# Altium schematic symbol library Analog Devices Data Converters Analog-to-Digital Converters.SchLib: 2404 symbols (part 15 of 213) (continued)
## AD7147WPACPZ-1500R (continued)

## AD7147WPACPZ-RL
designator U?
13 Channel CapTouch Programmable Controller for Single-Electrode Capacitance Sensors, 111SPS, -40 to +85 degC, CP-24-3, Pb-Free, Reel; Generic Part Number: AD7147; Manufacturer: Analog Devices; PartNumber: AD7147WPACPZ-RL; Resolution (Bits): 16; Channels: 13; Throughput Rate (SPS): 111; Interface: I2C/Ser 2-Wire, Ser, SPI; Automotive Qualified: Yes; DatasheetVersion: Rev.D; PackageVersion: Jan-2005; PackageReference: CP-24-3; PackageDescription: 24-Lead Lead Frame Chip Scale Package [LFCSP_VQ] 4 x 4 mm Body, Very Thin Quad; Supplier 1: Digi-Key; Supplier Part Number 1: AD7147WPACPZ-RL-ND; Supplier 2: Mouser; Supplier Part Number 2: 584-AD7147WPACPZ-R; RoHS: Y; Packing: Reel; Mounting Technology: Surface Mount; Code_JEDEC: MO-220-VGGD-8; ComponentLink1Description: Manufacturer URL; ComponentLink1URL: http://www.analog.com/en/index.html; ComponentLink2Description: Datasheet; ComponentLink2URL: http://www.analog.com/static/imported-files/data_sheets/AD7147.pdf; ComponentLink3Description: Package Specification; ComponentLink3URL: http://www.analog.com/static/imported-files/packages/56702234806764CP_24_3.pdf; ComponentLink4Description: Product URL; ComponentLink4URL: http://www.analog.com/en/analog-to-digital-converters/ad-converters/ad7147/products/product.html
footprint CP-24-3_N (QFN, 24-Leads, Body 4x4mm, Pitch 0.5mm, Thermal Pad 2.5x2.5mm, IPC Medium Density)
footprint CP-24-3_L (QFN, 24-Leads, Body 4x4mm, Pitch 0.5mm, Thermal Pad 2.5x2.5mm, IPC High Density)
footprint CP-24-3_M (QFN, 24-Leads, Body 4x4mm, Pitch 0.5mm, Thermal Pad 2.5x2.5mm, IPC Low Density)
pins: 1 CIN6 (in) "Capacitance Sensor Input.", 2 CIN7 (in) "Capacitance Sensor Input.", 3 CIN8 (in) "Capacitance Sensor Input.", 4 CIN9 (in) "Capacitance Sensor Input.", 5 CIN10 (in) "Capacitance Sensor Input.", 6 CIN11 (in) "Capacitance Sensor Input.", 7 CIN12 (in) "Capacitance Sensor Input.", 8 ACSHIELD (out) "CDC Active Shield Output. Connect to external shield or plane.", 9 BIAS "Bias Node for Internal Circuitry. Requires 100 nF capacitor to ground.", 10 GND (power) "Ground Reference Point for All Circuitry.", 11 VCC (power) "Supply Voltage.", 12 VDRIVE (power) "Serial Interface Operating Voltage Supply.", 13 SDO (hiz) "SPI Serial Data Output.", 14 SDI (in) "SPI Serial Data Input.", 15 SCLK (in) "Clock Input for Serial Interface.", 16 ~{CS} (in) "SPI Chip Select Signal.", 17 ~{INT} (oc) "General-Purpose Open-Drain Interrupt Output. Programmable polarity; requires pull-up resistor.", 18 GPIO (io) "Programmable GPIO.", 19 CIN0 (in) "Capacitance Sensor Input.", 20 CIN1 (in) "Capacitance Sensor Input.", 21 CIN2 (in) "Capacitance Sensor Input.", 22 CIN3 (in) "Capacitance Sensor Input.", 23 CIN4 (in) "Capacitance Sensor Input.", 24 CIN5 (in) "Capacitance Sensor Input.", 25 EP (power) "Capacitance Sensor Input."

## AD7148ACPZ-1REEL
designator U?
Octal 16-Bit Analog-to-Digital Converter with I2C/Ser 2-Wire, Serial Interface, 250kSPS, -40 to +85 degC, CP-16-13, Pb-Free, Reel; Generic Part Number: AD7148; Manufacturer: Analog Devices; PartNumber: AD7148ACPZ-1REEL; Resolution (Bits): 16; Channels: 8; Throughput Rate (SPS): 4; DatasheetVersion: Rev.A; PackageVersion: 031006-A; PackageReference: CP-16-13; PackageDescription: 16-Lead Lead Frame Chip Scale Package [LFCSP_VQ] 4 x 4 mm Body, Very Thin Quad; Supplier 1: Digi-Key; Supplier Part Number 1: AD7148ACPZ-1REEL-ND; Supplier 2: Mouser; Supplier Part Number 2: 584-AD7148ACPZ-1R; Interface: I2C/Ser 2-Wire, Ser; RoHS: Y; Packing: Reel; Mounting Technology: Surface Mount; Code_JEDEC: MO-220-VGGC; ComponentLink1Description: Manufacturer URL; ComponentLink1URL: http://www.analog.com/en/index.html; ComponentLink2Description: Datasheet; ComponentLink2URL: http://www.analog.com/static/imported-files/data_sheets/AD7148.pdf; ComponentLink3Description: Package Specification; ComponentLink3URL: http://www.analog.com/static/imported-files/packages/PKG_PDF/LFCSP(CP)/CP-16/CP_16_13.pdf; ComponentLink4Description: Product URL; ComponentLink4URL: http://www.analog.com/en/analog-to-digital-converters/ad-converters/ad7148/products/product.html
footprint CP-16-13_N (QFN, 16-Leads, Body 4x4mm, Pitch 0.65mm, Thermal Pad 2.5x2.5mm, IPC Medium Density)
footprint CP-16-13_L (QFN, 16-Leads, Body 4x4mm, Pitch 0.65mm, Thermal Pad 2.5x2.5mm, IPC High Density)
footprint CP-16-13_M (QFN, 16-Leads, Body 4x4mm, Pitch 0.65mm, Thermal Pad 2.5x2.5mm, IPC Low Density)
pins: 1 CIN4 (in) "Capacitance Sensor Input.", 2 CIN5 (in) "Capacitance Sensor Input.", 3 CIN6 (in) "Capacitance Sensor Input.", 4 CIN7 (in) "Capacitance Sensor Input.", 5 ACSHIELD (out) "CDC Active Shield Output. Connect to external shield.", 6 BIAS "Bias Node for Internal Circuitry. Requires 100 nF capacitor to ground.", 7 GND (power) "Ground Reference Point for All Circuitry.", 8 VCC (power) "Supply Voltage.", 9 VDRIVE (power) "Serial Interface Operating Voltage Supply.", 10 SDA (io) "I2C Serial Data Input/Output. SDA requires pull-up resistor.", 11 SCLK (in) "Clock Input for Serial Interface.", 12 ~{INT} (oc) "General-Purpose Open-Drain Interrupt Output. Programmable polarity; requires pull-up resistor.", 13 CIN0 (in) "Capacitance Sensor Input.", 14 CIN1 (in) "Capacitance Sensor Input.", 15 CIN2 (in) "Capacitance Sensor Input.", 16 CIN3 (in) "Capacitance Sensor Input.", 17 EP (power) "The exposed pad is not connected internally. For increased reliability of the solder joint and maximum thermal capability, it is recommended that the pad be soldered to the ground plane."

## AD7148ACPZ-1500RL7
designator U?
Octal 16-Bit Analog-to-Digital Converter with I2C/Ser 2-Wire, Serial Interface, 250kSPS, -40 to +85 degC, CP-16-13, Pb-Free, Reel; Generic Part Number: AD7148; Manufacturer: Analog Devices; PartNumber: AD7148ACPZ-1500RL7; Resolution (Bits): 16; Channels: 8; Throughput Rate (SPS): 4; DatasheetVersion: Rev.A; PackageVersion: 031006-A; PackageReference: CP-16-13; PackageDescription: 16-Lead Lead Frame Chip Scale Package [LFCSP_VQ] 4 x 4 mm Body, Very Thin Quad; Supplier 1: Digi-Key; Supplier Part Number 1: AD7148ACPZ-1500RL7TR-ND; Supplier 2: Digi-Key; Supplier Part Number 2: AD7148ACPZ-1500RL7CT-ND; Supplier 3: Digi-Key; Supplier Part Number 3: AD7148ACPZ-1500RL7DKR-ND; Supplier 4: Newark; Supplier Part Number 4: 84M7803; Supplier 5: Mouser; Supplier Part Number 5: 584-AD7148ACPZ1500R7; Interface: I2C/Ser 2-Wire, Ser; RoHS: Y; Packing: Reel; Mounting Technology: Surface Mount; Code_JEDEC: MO-220-VGGC; ComponentLink1Description: Manufacturer URL; ComponentLink1URL: http://www.analog.com/en/index.html; ComponentLink2Description: Datasheet; ComponentLink2URL: http://www.analog.com/static/imported-files/data_sheets/AD7148.pdf; ComponentLink3Description: Package Specification; ComponentLink3URL: http://www.analog.com/static/imported-files/packages/PKG_PDF/LFCSP(CP)/CP-16/CP_16_13.pdf; ComponentLink4Description: Product URL; ComponentLink4URL: http://www.analog.com/en/analog-to-digital-converters/ad-converters/ad7148/products/product.html
footprint CP-16-13_N (QFN, 16-Leads, Body 4x4mm, Pitch 0.65mm, Thermal Pad 2.5x2.5mm, IPC Medium Density)
footprint CP-16-13_L (QFN, 16-Leads, Body 4x4mm, Pitch 0.65mm, Thermal Pad 2.5x2.5mm, IPC High Density)
footprint CP-16-13_M (QFN, 16-Leads, Body 4x4mm, Pitch 0.65mm, Thermal Pad 2.5x2.5mm, IPC Low Density)
pins: 1 CIN4 (in) "Capacitance Sensor Input.", 2 CIN5 (in) "Capacitance Sensor Input.", 3 CIN6 (in) "Capacitance Sensor Input.", 4 CIN7 (in) "Capacitance Sensor Input.", 5 ACSHIELD (out) "CDC Active Shield Output. Connect to external shield.", 6 BIAS "Bias Node for Internal Circuitry. Requires 100 nF capacitor to ground.", 7 GND (power) "Ground Reference Point for All Circuitry.", 8 VCC (power) "Supply Voltage.", 9 VDRIVE (power) "Serial Interface Operating Voltage Supply.", 10 SDA (io) "I2C Serial Data Input/Output. SDA requires pull-up resistor.", 11 SCLK (in) "Clock Input for Serial Interface.", 12 ~{INT} (oc) "General-Purpose Open-Drain Interrupt Output. Programmable polarity; requires pull-up resistor.", 13 CIN0 (in) "Capacitance Sensor Input.", 14 CIN1 (in) "Capacitance Sensor Input.", 15 CIN2 (in) "Capacitance Sensor Input.", 16 CIN3 (in) "Capacitance Sensor Input.", 17 EP (power) "The exposed pad is not connected internally. For increased reliability of the solder joint and maximum thermal capability, it is recommended that the pad be soldered to the ground plane."

## AD7150BRMZ
designator U?
Dual 12-Bit Low Power Analog-to-Digital Converter with I2C/Ser 2-Wire, Serial Interface, 200SPS, -40 to +85 degC, RM-10, Pb-Free, Tube; Generic Part Number: AD7150; Manufacturer: Analog Devices; PartNumber: AD7150BRMZ; Resolution (Bits): 12; Channels: 2; Throughput Rate (SPS): 200; DatasheetVersion: Rev.0; PackageVersion: May-2005; PackageReference: RM-10; PackageDescription: 10-Lead Mini Small Outline Package [MSOP]; Supplier 1: Digi-Key; Supplier Part Number 1: AD7150BRMZ-ND; Supplier 2: Farnell; Supplier Part Number 2: 1563482; Supplier 3: Newark; Supplier Part Number 3: 64M7550; Supplier 4: Mouser; Supplier Part Number 4: 584-AD7150BRMZ; Interface: I2C/Ser 2-Wire, Ser; RoHS: Y; Packing: Tube; Mounting Technology: Surface Mount; ComponentLink1Description: Manufacturer URL; ComponentLink1URL: http://www.analog.com/en/index.html; ComponentLink2Description: Datasheet; ComponentLink2URL: http://www.analog.com/static/imported-files/data_sheets/AD7150.pdf; ComponentLink3Description: Package Specification; ComponentLink3URL: http://www.analog.com/static/imported-files/packages/PKG_PDF/MSOP%28RM%29/RM_10.pdf; ComponentLink4Description: Product URL; ComponentLink4URL: http://www.analog.com/en/analog-to-digital-converters/ad-converters/ad7150/products/product.html
footprint RM-10_N (TSSOP, 10-Leads, Body 3x3mm, Pitch 0.5mm, IPC Medium Density)
footprint RM-10_L (TSSOP, 10-Leads, Body 3x3mm, Pitch 0.5mm, IPC High Density)
footprint RM-10_M (TSSOP, 10-Leads, Body 3x3mm, Pitch 0.5mm, IPC Low Density)
pins: 1 GND (power) "Ground Pin.", 2 VDD (power) "Power Supply Voltage. This pin should be decoupled to GND using a low impedance capacitor, for example, 0.1uF X7R multilayer ceramic.", 3 CIN2 (in) "CDC Capacitive Input Channel 2. The measured capacitance (sensor) is connected between the EXC2 pin and the CIN2 pin. If not used, this pin can be left open circuit or connected to GND.", 4 CIN1 (in) "CDC Capacitive Input Channel 1. The measured capacitance (sensor) is connected between the EXC1 pin and the CIN1 pin. If not used, this pin can be left open circuit or connected to GND.", 5 EXC2 (out) "CDC Excitation Output Channel 2. The measured capacitance is connected between the EXC2 pin and the CIN2 pin. If not used, this pin should be left as an open circuit.", 6 EXC1 (out) "CDC Excitation Output Channel 1. The measured capacitance is connected between the EXC1 pin and the CIN1 pin. If not used, this pin should be left as an open circuit.", 7 OUT1 (out) "Logic Output Channel 1. A high level on this output indicates proximity detected on CIN1.", 8 OUT2 (out) "Logic Output Channel 2. A high level on this output indicates proximity detected on CIN2.", 9 SCL (in) "Serial Interface Clock Input. Connects to the master clock line. Requires a pull-up resistor if not provided elsewhere in the system.", 10 SDA (io) "Serial Interface Bidirectional Data. Connects to the master data line. Requires a pull-up resistor if not provided elsewhere in the system."

## AD7150BRMZ-REEL
designator U?
Dual 12-Bit Low Power Analog-to-Digital Converter with I2C/Ser 2-Wire, Serial Interface, 200SPS, -40 to +85 degC, RM-10, Pb-Free, Reel; Generic Part Number: AD7150; Manufacturer: Analog Devices; PartNumber: AD7150BRMZ-REEL; Resolution (Bits): 12; Channels: 2; Throughput Rate (SPS): 200; DatasheetVersion: Rev.0; PackageVersion: May-2005; PackageReference: RM-10; PackageDescription: 10-Lead Mini Small Outline Package [MSOP]; Supplier 1: Digi-Key; Supplier Part Number 1: AD7150BRMZ-REEL-ND; Supplier 2: Newark; Supplier Part Number 2: 64M7551; Supplier 3: Mouser; Supplier Part Number 3: 584-AD7150BRMZ-R; Interface: I2C/Ser 2-Wire, Ser; RoHS: Y; Packing: Reel; Mounting Technology: Surface Mount; ComponentLink1Description: Manufacturer URL; ComponentLink1URL: http://www.analog.com/en/index.html; ComponentLink2Description: Datasheet; ComponentLink2URL: http://www.analog.com/static/imported-files/data_sheets/AD7150.pdf; ComponentLink3Description: Package Specification; ComponentLink3URL: http://www.analog.com/static/imported-files/packages/PKG_PDF/MSOP%28RM%29/RM_10.pdf; ComponentLink4Description: Product URL; ComponentLink4URL: http://www.analog.com/en/analog-to-digital-converters/ad-converters/ad7150/products/product.html
footprint RM-10_N (TSSOP, 10-Leads, Body 3x3mm, Pitch 0.5mm, IPC Medium Density)
footprint RM-10_L (TSSOP, 10-Leads, Body 3x3mm, Pitch 0.5mm, IPC High Density)
footprint RM-10_M (TSSOP, 10-Leads, Body 3x3mm, Pitch 0.5mm, IPC Low Density)
pins: 1 GND (power) "Ground Pin.", 2 VDD (power) "Power Supply Voltage. This pin should be decoupled to GND using a low impedance capacitor, for example, 0.1uF X7R multilayer ceramic.", 3 CIN2 (in) "CDC Capacitive Input Channel 2. The measured capacitance (sensor) is connected between the EXC2 pin and the CIN2 pin. If not used, this pin can be left open circuit or connected to GND.", 4 CIN1 (in) "CDC Capacitive Input Channel 1. The measured capacitance (sensor) is connected between the EXC1 pin and the CIN1 pin. If not used, this pin can be left open circuit or connected to GND.", 5 EXC2 (out) "CDC Excitation Output Channel 2. The measured capacitance is connected between the EXC2 pin and the CIN2 pin. If not used, this pin should be left as an open circuit.", 6 EXC1 (out) "CDC Excitation Output Channel 1. The measured capacitance is connected between the EXC1 pin and the CIN1 pin. If not used, this pin should be left as an open circuit.", 7 OUT1 (out) "Logic Output Channel 1. A high level on this output indicates proximity detected on CIN1.", 8 OUT2 (out) "Logic Output Channel 2. A high level on this output indicates proximity detected on CIN2.", 9 SCL (in) "Serial Interface Clock Input. Connects to the master clock line. Requires a pull-up resistor if not provided elsewhere in the system.", 10 SDA (io) "Serial Interface Bidirectional Data. Connects to the master data line. Requires a pull-up resistor if not provided elsewhere in the system."

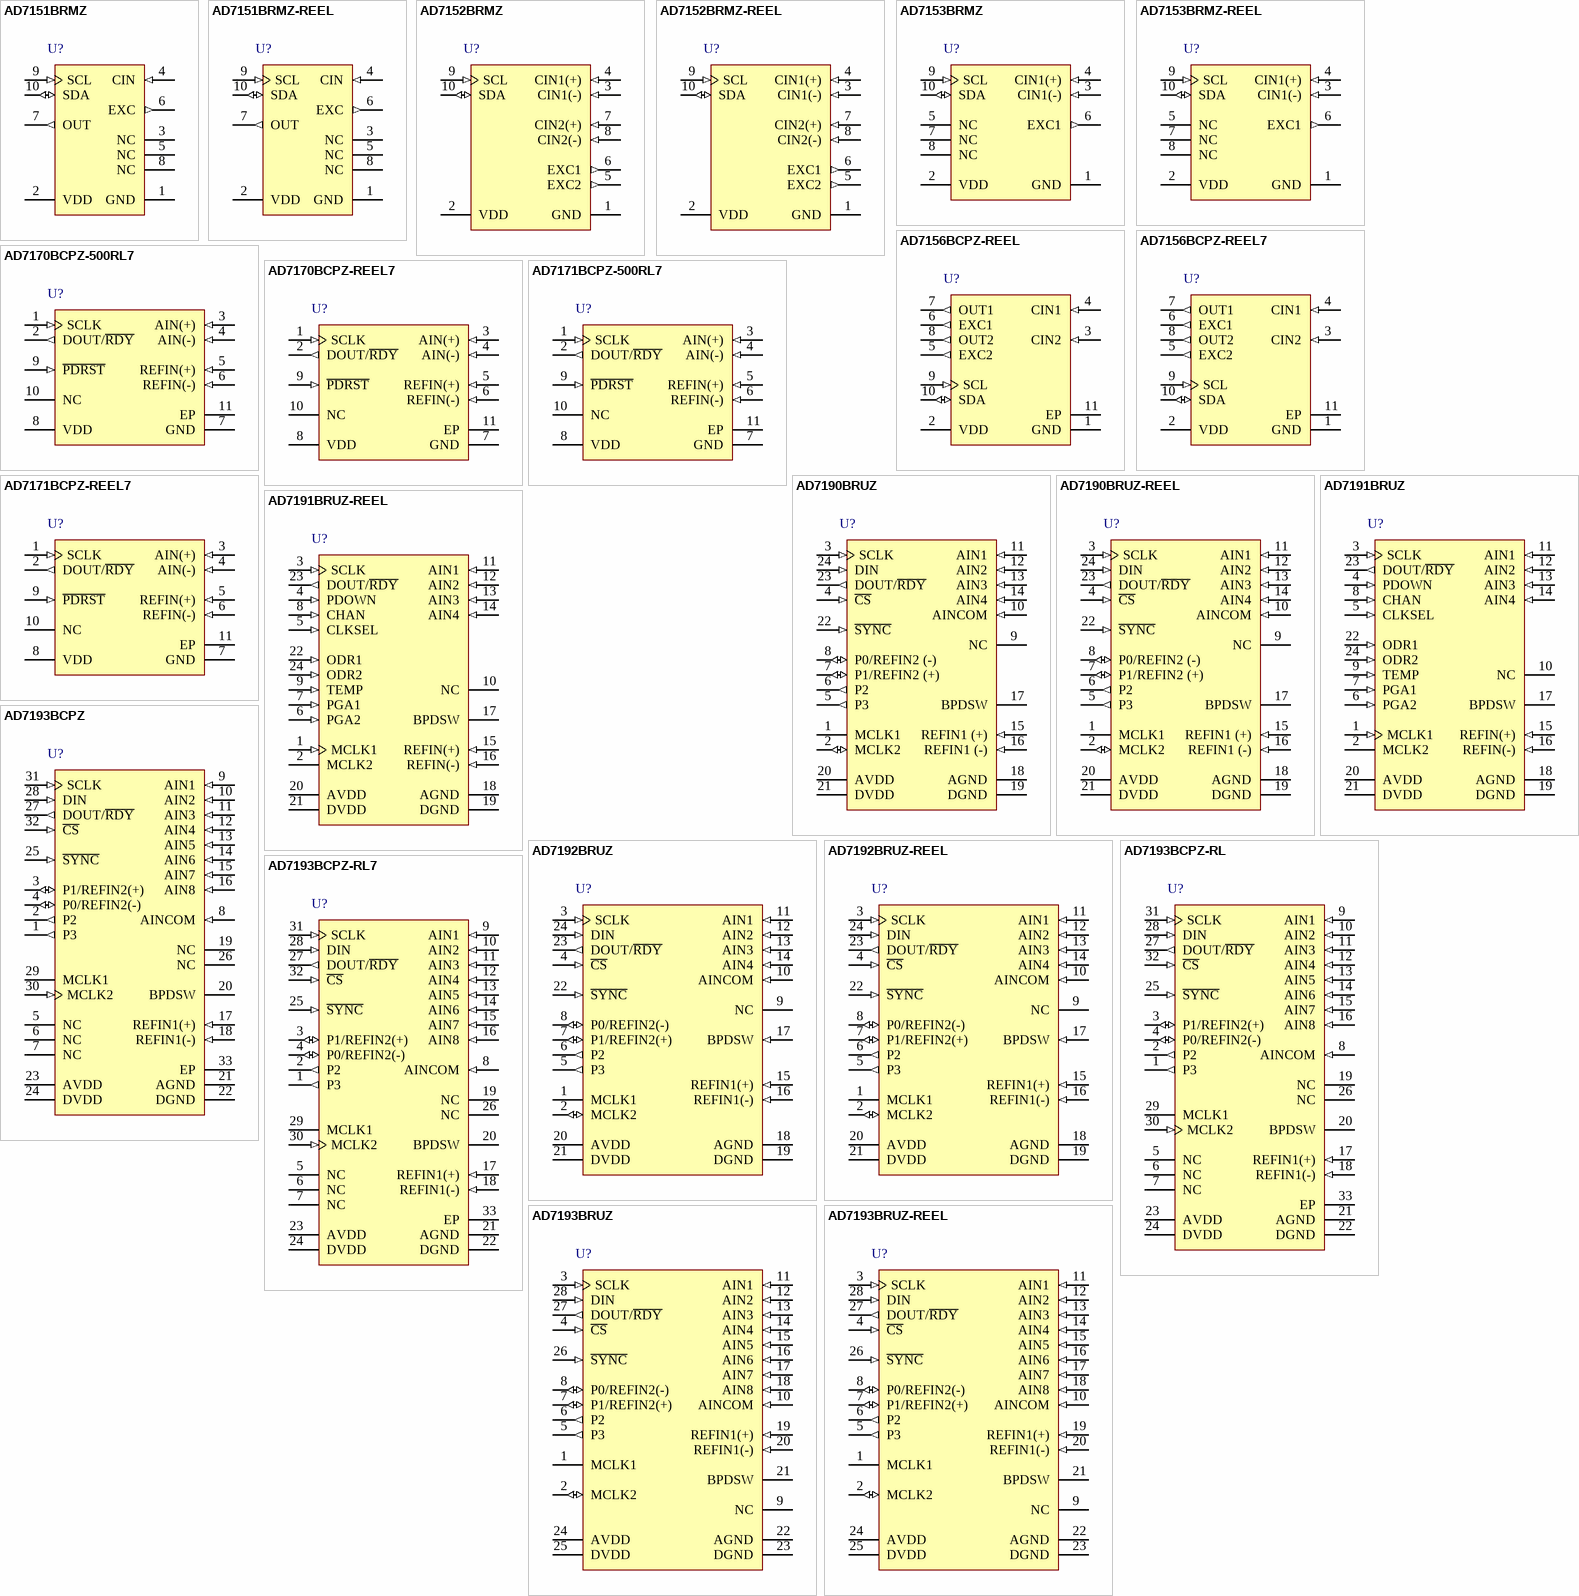
[diagram p14: symbols AD7151BRMZ to AD7193BRUZ-REEL]

## AD7151BRMZ
designator U?
Single 12-Bit Low Power Analog-to-Digital Converter with I2C/Ser 2-Wire, Serial Interface, 100SPS, -40 to +85 degC, RM-10, Pb-Free, Tube; Generic Part Number: AD7151; Manufacturer: Analog Devices; PartNumber: AD7151BRMZ; Resolution (Bits): 12; Channels: 1; Throughput Rate (SPS): 100; DatasheetVersion: Rev.0; PackageVersion: May-2005; PackageReference: RM-10; PackageDescription: 10-Lead Mini Small Outline Package [MSOP]; Supplier 1: Digi-Key; Supplier Part Number 1: AD7151BRMZ-ND; Supplier 2: Newark; Supplier Part Number 2: 64M7552; Supplier 3: Mouser; Supplier Part Number 3: 584-AD7151BRMZ; Interface: I2C/Ser 2-Wire, Ser; RoHS: Y; Packing: Tube; Mounting Technology: Surface Mount; ComponentLink1Description: Manufacturer URL; ComponentLink1URL: http://www.analog.com/en/index.html; ComponentLink2Description: Datasheet; ComponentLink2URL: http://www.analog.com/static/imported-files/data_sheets/AD7151.pdf; ComponentLink3Description: Package Specification; ComponentLink3URL: http://www.analog.com/static/imported-files/packages/PKG_PDF/MSOP%28RM%29/RM_10.pdf; ComponentLink4Description: Product URL; ComponentLink4URL: http://www.analog.com/en/analog-to-digital-converters/ad-converters/ad7151/products/product.html
footprint RM-10_N (TSSOP, 10-Leads, Body 3x3mm, Pitch 0.5mm, IPC Medium Density)
footprint RM-10_L (TSSOP, 10-Leads, Body 3x3mm, Pitch 0.5mm, IPC High Density)
footprint RM-10_M (TSSOP, 10-Leads, Body 3x3mm, Pitch 0.5mm, IPC Low Density)
pins: 1 GND (power) "Ground Pin.", 2 VDD (power) "Power Supply Voltage. This pin should be decoupled to GND using a low impedance capacitor, for example, 0.1 uF X7R multilayer ceramic.", 3 NC "This pin should be left as an open circuit or connected to GND.", 4 CIN (in) "CDC Capacitive Input. The measured capacitance (sensor) is connected between the EXC pin and the CIN pin.", 5 NC "This pin should be left as an open circuit.", 6 EXC (out) "CDC Excitation Output. The measured capacitance is connected between the EXC pin and the CIN pin.", 7 OUT (out) "Logic Output. High level on this output indicates proximity detected on the capacitive input.", 8 NC "This pin should be left as an open circuit.", 9 SCL (in) "Serial Interface Clock Input. Connects to the master clock line. Requires a pull-up resistor if not provided elsewhere in the system.", 10 SDA (io) "Serial Interface Bidirectional Data. Connects to the master data line. Requires a pull-up resistor if not provided elsewhere in the system."

## AD7151BRMZ-REEL
designator U?
Single 12-Bit Low Power Analog-to-Digital Converter with I2C/Ser 2-Wire, Serial Interface, 100SPS, -40 to +85 degC, RM-10, Pb-Free, Reel; Generic Part Number: AD7151; Manufacturer: Analog Devices; PartNumber: AD7151BRMZ-REEL; Resolution (Bits): 12; Channels: 1; Throughput Rate (SPS): 100; DatasheetVersion: Rev.0; PackageVersion: May-2005; PackageReference: RM-10; PackageDescription: 10-Lead Mini Small Outline Package [MSOP]; Supplier 1: Digi-Key; Supplier Part Number 1: AD7151BRMZ-REEL-ND; Supplier 2: Mouser; Supplier Part Number 2: 584-AD7151BRMZ-R; Interface: I2C/Ser 2-Wire, Ser; RoHS: Y; Packing: Reel; Mounting Technology: Surface Mount; ComponentLink1Description: Manufacturer URL; ComponentLink1URL: http://www.analog.com/en/index.html; ComponentLink2Description: Datasheet; ComponentLink2URL: http://www.analog.com/static/imported-files/data_sheets/AD7151.pdf; ComponentLink3Description: Package Specification; ComponentLink3URL: http://www.analog.com/static/imported-files/packages/PKG_PDF/MSOP%28RM%29/RM_10.pdf; ComponentLink4Description: Product URL; ComponentLink4URL: http://www.analog.com/en/analog-to-digital-converters/ad-converters/ad7151/products/product.html
footprint RM-10_N (TSSOP, 10-Leads, Body 3x3mm, Pitch 0.5mm, IPC Medium Density)
footprint RM-10_L (TSSOP, 10-Leads, Body 3x3mm, Pitch 0.5mm, IPC High Density)
footprint RM-10_M (TSSOP, 10-Leads, Body 3x3mm, Pitch 0.5mm, IPC Low Density)
pins: 1 GND (power) "Ground Pin.", 2 VDD (power) "Power Supply Voltage. This pin should be decoupled to GND using a low impedance capacitor, for example, 0.1 uF X7R multilayer ceramic.", 3 NC "This pin should be left as an open circuit or connected to GND.", 4 CIN (in) "CDC Capacitive Input. The measured capacitance (sensor) is connected between the EXC pin and the CIN pin.", 5 NC "This pin should be left as an open circuit.", 6 EXC (out) "CDC Excitation Output. The measured capacitance is connected between the EXC pin and the CIN pin.", 7 OUT (out) "Logic Output. High level on this output indicates proximity detected on the capacitive input.", 8 NC "This pin should be left as an open circuit.", 9 SCL (in) "Serial Interface Clock Input. Connects to the master clock line. Requires a pull-up resistor if not provided elsewhere in the system.", 10 SDA (io) "Serial Interface Bidirectional Data. Connects to the master data line. Requires a pull-up resistor if not provided elsewhere in the system."

## AD7152BRMZ
designator U?
Dual 12-Bit Capacitance-to-Digital Converter with I2C/Ser 2-Wire, Serial Interface, 200SPS, -40 to +85 degC, RM-10, Pb-Free, Tube; Generic Part Number: AD7152; Manufacturer: Analog Devices; PartNumber: AD7152BRMZ; Resolution (Bits): 12; Channels: 2; Throughput Rate (SPS): 200; DatasheetVersion: Rev.0; PackageVersion: May-2005; PackageReference: RM-10; PackageDescription: 10-Lead Mini Small Outline Package [MSOP]; Supplier 1: Digi-Key; Supplier Part Number 1: AD7152BRMZ-ND; Supplier 2: Mouser; Supplier Part Number 2: 584-AD7152BRMZ; Interface: I2C/Ser 2-Wire, Ser; RoHS: Y; Packing: Tube; Mounting Technology: Surface Mount; ComponentLink1Description: Manufacturer URL; ComponentLink1URL: http://www.analog.com/en/index.html; ComponentLink2Description: Datasheet; ComponentLink2URL: http://www.analog.com/static/imported-files/data_sheets/AD7152_7153.pdf; ComponentLink3Description: Package Specification; ComponentLink3URL: http://www.analog.com/static/imported-files/packages/PKG_PDF/MSOP%28RM%29/RM_10.pdf; ComponentLink4Description: Product URL; ComponentLink4URL: http://www.analog.com/en/analog-to-digital-converters/ad-converters/ad7152/products/product.html
footprint RM-10_N (TSSOP, 10-Leads, Body 3x3mm, Pitch 0.5mm, IPC Medium Density)
footprint RM-10_L (TSSOP, 10-Leads, Body 3x3mm, Pitch 0.5mm, IPC High Density)
footprint RM-10_M (TSSOP, 10-Leads, Body 3x3mm, Pitch 0.5mm, IPC Low Density)
pins: 1 GND (power) "Ground Pin.", 2 VDD (power) "Power Supply Voltage. This pin should be decoupled to GND, using a low impedance capacitor, for example, in combination with a 10 uF tantalum and a 0.1 uF multilayer ceramic capacitor.", 3 CIN1(-) (in) "CDC Negative Capacitive Input of Channel 1. If not used, this pin can be left as an open circuit or connected to GND. This pin is internally disconnected in single-ended CDC configuration.", 4 CIN1(+) (in) "CDC Positive Capacitive Input of Channel 1. If not used, this pin can be left as an open circuit or connected to GND.", 5 EXC2 (out) "CDC Excitation Output for Channel 2. The measured capacitance is connected between one of the EXC pins and one of the CIN pins. If not used, these pins should be left as an open circuit.", 6 EXC1 (out) "CDC Excitation Output for Channel 1. The measured capacitance is connected between one of the EXC pins and one of the CIN pins. If not used, these pins should be left as an open circuit.", 7 CIN2(+) (in) "CDC Positive Capacitive Input of Channel 2. If not used, this pin can be left as an open circuit or connected to GND.", 8 CIN2(-) (in) "CDC Negative Capacitive Input of Channel 2. If not used, this pin can be left as an open circuit or connected to GND. This pin is internally disconnected in single-ended CDC configuration.", 9 SCL (in) "Serial Interface Clock Input. Connects to the master clock line. Requires a pull-up resistor if one is not already provided in the system.", 10 SDA (io) "Serial Interface Bidirectional Data. Connects to the master data line. Requires a pull-up resistor if one is not provided elsewhere in the system."

## AD7152BRMZ-REEL
designator U?
Dual 12-Bit Capacitance-to-Digital Converter with I2C/Ser 2-Wire, Serial Interface, 200SPS, -40 to +85 degC, RM-10, Pb-Free, Reel; Generic Part Number: AD7152; Manufacturer: Analog Devices; PartNumber: AD7152BRMZ-REEL; Resolution (Bits): 12; Channels: 2; Throughput Rate (SPS): 200; DatasheetVersion: Rev.0; PackageVersion: May-2005; PackageReference: RM-10; PackageDescription: 10-Lead Mini Small Outline Package [MSOP]; Supplier 1: Digi-Key; Supplier Part Number 1: AD7152BRMZ-REEL-ND; Supplier 2: Mouser; Supplier Part Number 2: 584-AD7152BRMZ-R; Interface: I2C/Ser 2-Wire, Ser; RoHS: Y; Packing: Reel; Mounting Technology: Surface Mount; ComponentLink1Description: Manufacturer URL; ComponentLink1URL: http://www.analog.com/en/index.html; ComponentLink2Description: Datasheet; ComponentLink2URL: http://www.analog.com/static/imported-files/data_sheets/AD7152_7153.pdf; ComponentLink3Description: Package Specification; ComponentLink3URL: http://www.analog.com/static/imported-files/packages/PKG_PDF/MSOP%28RM%29/RM_10.pdf; ComponentLink4Description: Product URL; ComponentLink4URL: http://www.analog.com/en/analog-to-digital-converters/ad-converters/ad7152/products/product.html
footprint RM-10_N (TSSOP, 10-Leads, Body 3x3mm, Pitch 0.5mm, IPC Medium Density)
footprint RM-10_L (TSSOP, 10-Leads, Body 3x3mm, Pitch 0.5mm, IPC High Density)
footprint RM-10_M (TSSOP, 10-Leads, Body 3x3mm, Pitch 0.5mm, IPC Low Density)
pins: 1 GND (power) "Ground Pin.", 2 VDD (power) "Power Supply Voltage. This pin should be decoupled to GND, using a low impedance capacitor, for example, in combination with a 10 uF tantalum and a 0.1 uF multilayer ceramic capacitor.", 3 CIN1(-) (in) "CDC Negative Capacitive Input of Channel 1. If not used, this pin can be left as an open circuit or connected to GND. This pin is internally disconnected in single-ended CDC configuration.", 4 CIN1(+) (in) "CDC Positive Capacitive Input of Channel 1. If not used, this pin can be left as an open circuit or connected to GND.", 5 EXC2 (out) "CDC Excitation Output for Channel 2. The measured capacitance is connected between one of the EXC pins and one of the CIN pins. If not used, these pins should be left as an open circuit.", 6 EXC1 (out) "CDC Excitation Output for Channel 1. The measured capacitance is connected between one of the EXC pins and one of the CIN pins. If not used, these pins should be left as an open circuit.", 7 CIN2(+) (in) "CDC Positive Capacitive Input of Channel 2. If not used, this pin can be left as an open circuit or connected to GND.", 8 CIN2(-) (in) "CDC Negative Capacitive Input of Channel 2. If not used, this pin can be left as an open circuit or connected to GND. This pin is internally disconnected in single-ended CDC configuration.", 9 SCL (in) "Serial Interface Clock Input. Connects to the master clock line. Requires a pull-up resistor if one is not already provided in the system.", 10 SDA (io) "Serial Interface Bidirectional Data. Connects to the master data line. Requires a pull-up resistor if one is not provided elsewhere in the system."

## AD7153BRMZ
designator U?
Single 12-Bit Capacitance-to-Digital Converter with I2C/Ser 2-Wire, Serial Interface, 200SPS, -40 to +85 degC, RM-10, Pb-Free, Tube; Generic Part Number: AD7153; Manufacturer: Analog Devices; PartNumber: AD7153BRMZ; Resolution (Bits): 12; Channels: 1; Throughput Rate (SPS): 200; DatasheetVersion: Rev.0; PackageVersion: May-2005; PackageReference: RM-10; PackageDescription: 10-Lead Mini Small Outline Package [MSOP]; Supplier 1: Digi-Key; Supplier Part Number 1: AD7153BRMZ-ND; Supplier 2: Newark; Supplier Part Number 2: 11N8856; Supplier 3: Mouser; Supplier Part Number 3: 584-AD7153BRMZ; Interface: I2C/Ser 2-Wire, Ser; RoHS: Y; Packing: Tube; Mounting Technology: Surface Mount; ComponentLink1Description: Manufacturer URL; ComponentLink1URL: http://www.analog.com/en/index.html; ComponentLink2Description: Datasheet; ComponentLink2URL: http://www.analog.com/static/imported-files/data_sheets/AD7152_7153.pdf; ComponentLink3Description: Package Specification; ComponentLink3URL: http://www.analog.com/static/imported-files/packages/PKG_PDF/MSOP%28RM%29/RM_10.pdf; ComponentLink4Description: Product URL; ComponentLink4URL: http://www.analog.com/en/analog-to-digital-converters/ad-converters/ad7153/products/product.html
footprint RM-10_N (TSSOP, 10-Leads, Body 3x3mm, Pitch 0.5mm, IPC Medium Density)
footprint RM-10_L (TSSOP, 10-Leads, Body 3x3mm, Pitch 0.5mm, IPC High Density)
footprint RM-10_M (TSSOP, 10-Leads, Body 3x3mm, Pitch 0.5mm, IPC Low Density)
pins: 1 GND (power) "Ground Pin.", 2 VDD (power) "Power Supply Voltage. This pin should be decoupled to GND, using a low impedance capacitor, for example, in combination with a 10 uF tantalum and a 0.1 uF multilayer ceramic capacitor.", 3 CIN1(-) (in) "CDC Negative Capacitive Input of Channel 1. If not used, this pin can be left as an open circuit or connected to GND. This pin is internally disconnected in single-ended CDC configuration.", 4 CIN1(+) (in) "CDC Positive Capacitive Input of Channel 1. If not used, this pin can be left as an open circuit or connected to GND.", 5 NC "No Connect. This pin must be left as an open circuit.", 6 EXC1 (out) "CDC Excitation Output for Channel 1. The measured capacitance is connected between one of the EXC pins and one of the CIN pins. If not used, these pins should be left as an open circuit.", 7 NC "No Connect. This pin must be left as an open circuit.", 8 NC "No Connect. This pin must be left as an open circuit.", 9 SCL (in) "Serial Interface Clock Input. Connects to the master clock line. Requires a pull-up resistor if one is not already provided in the system.", 10 SDA (io) "Serial Interface Bidirectional Data. Connects to the master data line. Requires a pull-up resistor if one is not provided elsewhere in the system."

## AD7153BRMZ-REEL
designator U?
Single 12-Bit Capacitance-to-Digital Converter with I2C/Ser 2-Wire, Serial Interface, 200SPS, -40 to +85 degC, RM-10, Pb-Free, Reel; Generic Part Number: AD7153; Manufacturer: Analog Devices; PartNumber: AD7153BRMZ-REEL; Resolution (Bits): 12; Channels: 1; Throughput Rate (SPS): 200; DatasheetVersion: Rev.0; PackageVersion: May-2005; PackageReference: RM-10; PackageDescription: 10-Lead Mini Small Outline Package [MSOP]; Supplier 1: Digi-Key; Supplier Part Number 1: AD7153BRMZ-REEL-ND; Supplier 2: Mouser; Supplier Part Number 2: 584-AD7153BRMZ-R; Interface: I2C/Ser 2-Wire, Ser; RoHS: Y; Packing: Reel; Mounting Technology: Surface Mount; ComponentLink1Description: Manufacturer URL; ComponentLink1URL: http://www.analog.com/en/index.html; ComponentLink2Description: Datasheet; ComponentLink2URL: http://www.analog.com/static/imported-files/data_sheets/AD7152_7153.pdf; ComponentLink3Description: Package Specification; ComponentLink3URL: http://www.analog.com/static/imported-files/packages/PKG_PDF/MSOP%28RM%29/RM_10.pdf; ComponentLink4Description: Product URL; ComponentLink4URL: http://www.analog.com/en/analog-to-digital-converters/ad-converters/ad7153/products/product.html
footprint RM-10_N (TSSOP, 10-Leads, Body 3x3mm, Pitch 0.5mm, IPC Medium Density)
footprint RM-10_L (TSSOP, 10-Leads, Body 3x3mm, Pitch 0.5mm, IPC High Density)
footprint RM-10_M (TSSOP, 10-Leads, Body 3x3mm, Pitch 0.5mm, IPC Low Density)
pins: 1 GND (power) "Ground Pin.", 2 VDD (power) "Power Supply Voltage. This pin should be decoupled to GND, using a low impedance capacitor, for example, in combination with a 10 uF tantalum and a 0.1 uF multilayer ceramic capacitor.", 3 CIN1(-) (in) "CDC Negative Capacitive Input of Channel 1. If not used, this pin can be left as an open circuit or connected to GND. This pin is internally disconnected in single-ended CDC configuration.", 4 CIN1(+) (in) "CDC Positive Capacitive Input of Channel 1. If not used, this pin can be left as an open circuit or connected to GND.", 5 NC "No Connect. This pin must be left as an open circuit.", 6 EXC1 (out) "CDC Excitation Output for Channel 1. The measured capacitance is connected between one of the EXC pins and one of the CIN pins. If not used, these pins should be left as an open circuit.", 7 NC "No Connect. This pin must be left as an open circuit.", 8 NC "No Connect. This pin must be left as an open circuit.", 9 SCL (in) "Serial Interface Clock Input. Connects to the master clock line. Requires a pull-up resistor if one is not already provided in the system.", 10 SDA (io) "Serial Interface Bidirectional Data. Connects to the master data line. Requires a pull-up resistor if one is not provided elsewhere in the system."

## AD7156BCPZ-REEL
designator U?
Dual 12-Bit Analog-to-Digital Converter with I2C, Serial 2-Wire, Serial Interface, 100SPS, -40 to +85 degC, CP-10-9, Pb-Free, Reel; Generic Part Number: AD7156; Manufacturer: Analog Devices; PartNumber: AD7156BCPZ-REEL; Resolution (Bits): 12; Channels: 2; Throughput Rate (SPS): 100; Interface: I2C/Ser 2-Wire, Ser; DatasheetVersion: Rev.0; PackageVersion: 02-27-2012-B; PackageReference: CP-10-9; PackageDescription: 10-Lead Lead Frame Chip Scale Package [LFCSP_WD] 3 x 3 mm Body, Very Very Thin, Dual Lead; Supplier 1: Digi-Key; Supplier Part Number 1: AD7156BCPZ-REEL-ND; Supplier 2: Mouser; Supplier Part Number 2: 584-AD7156BCPZ-R; RoHS: Y; Packing: Reel; Mounting Technology: Surface Mount; ComponentLink1Description: Manufacturer URL; ComponentLink1URL: http://www.analog.com/en/index.html; ComponentLink2Description: Datasheet; ComponentLink2URL: http://www.analog.com/static/imported-files/data_sheets/AD7156.pdf; ComponentLink3Description: Package Specification; ComponentLink3URL: http://www.analog.com/static/imported-files/packages/CP_10_9.pdf; ComponentLink4Description: Product URL; ComponentLink4URL: http://www.analog.com/en/analog-to-digital-converters/ad-converters/ad7156/products/product.html
footprint CP-10-9_N (SON, 10-Leads, Body 3x3mm, Pitch 0.5mm, Thermal Pad 2.35x1.6mm, IPC Medium Density)
footprint CP-10-9_L (SON, 10-Leads, Body 3x3mm, Pitch 0.5mm, Thermal Pad 2.35x1.6mm, IPC High Density)
footprint CP-10-9_M (SON, 10-Leads, Body 3x3mm, Pitch 0.5mm, Thermal Pad 2.35x1.6mm, IPC Low Density)
pins: 1 GND (power) "Ground Pin.", 2 VDD (power) "Power Supply Voltage. This pin should be decoupled to GND using a low impedance capacitor, such as a0.1 uF X7R multilayer ceramic capacitor.", 3 CIN2 (in) "CDC Capacitive Input Channel 2. The measured capacitance (sensor) is connected between the EXC2 pin andthe CIN2 pin. If not used, this pin can be left open circuit or be connected to GND. When a conversion is performed on (See Datasheet)", 4 CIN1 (in) "CDC Capacitive Input Channel 1. The measured capacitance (sensor) is connected between the EXC1 pin and the CIN1 pin. If not used, this pin can be left open circuit or be connected to GND. When a conversion is performed on (See Datasheet)", 5 EXC2 (out) "CDC Excitation Output Channel 2. The measured capacitance is connected between the EXC2 pin and theCIN2 pin. If not used, this pin should be left as an open circuit. When a conversion is performed on Channel 2, the EXC2 pin (See Datasheet)", 6 EXC1 (out) "CDC Excitation Output Channel 1. The measured capacitance is connected between the EXC1 pin and theCIN1 pin. If not used, this pin should be left as an open circuit. When a conversion is performed on Channel 1, the EXC1 pin (See Datasheet)", 7 OUT1 (out) "Logic Output Channel 1. A high level on this output indicates proximity detected on CIN1.", 8 OUT2 (out) "Logic Output Channel 2. A high level on this output indicates proximity detected on CIN2.", 9 SCL (in) "Serial Interface Clock Input. This pin connects to the master clock line and requires a pull-up resistor if not provided elsewhere in the system.", 10 SDA (io) "Serial Interface Bidirectional Data. This pin connects to the master data line and requires a pull-up resistor if not provided elsewhere in the system.", 11 EP (power) "The exposed pad must be connected to GND or it must be isolated (floating)."